# Altium footprint library SparkFun-Retired.PCBLIB: 303 footprints (part 6 of 19)
Each footprint in its own frame and in the unit in brackets; x right, y up, seen from the top. Pads: shape width x height; smd on the part's side, far side on the other; paste and mask are expansions set on the pad; w line width, h text height; cw(c..) or ccw(c..) is an arc to the next point about the centre after c.
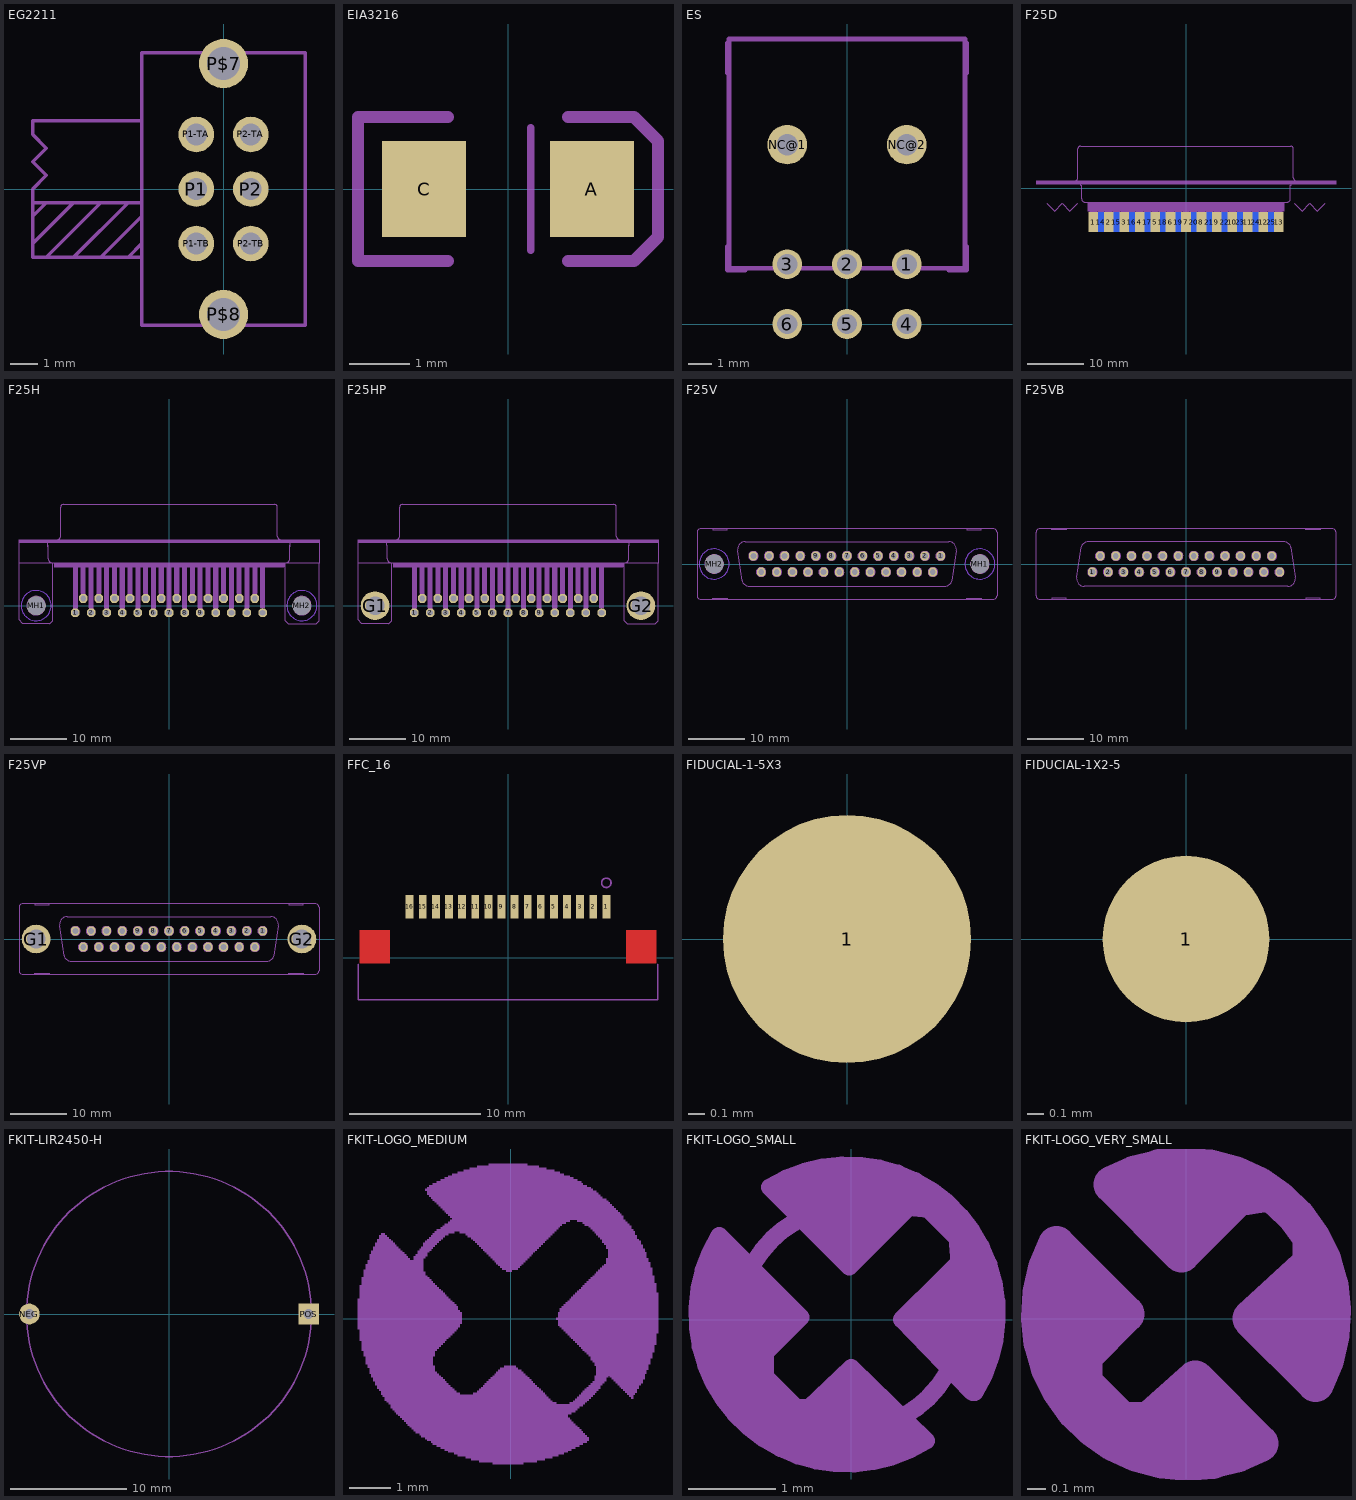
[diagram p5: the footprints below, top view; thin cyan lines are the x and y axes]

## EG2211 [mil]
pads (8):
  round 51.5 hole 31.5: P1(-39.37,0) P1-TA(-39.37,78.74) P1-TB(-39.37,-78.74) P2(39.37,0) P2-TA(39.37,78.74) P2-TB(39.37,-78.74)
  round 70.86 hole 47.24: P$7(0,181.1) P$8(0,-181.1)
tDocu:
  lines w5: -118.11,-59.06 -118.11,-39.37 ; -275.59,-78.74 -275.59,-98.43 -255.91,-98.43 ; -275.59,-78.74 -275.59,-39.37 ; -275.59,-78.74 -216.54,-19.69 ; -275.59,-39.37 -275.59,-19.69 ; -275.59,-39.37 -255.91,-19.69 ; -275.59,-19.69 -275.59,0 -255.91,19.69 -275.59,39.37 -255.91,59.06 -275.59,78.74 -275.59,98.43 -118.11,98.43 ; -275.59,-19.69 -255.91,-19.69 ; -255.91,-98.43 -216.54,-98.43 ; -255.91,-98.43 -177.17,-19.69 ; -255.91,-19.69 -216.54,-19.69 ; -216.54,-98.43 -177.17,-98.43 ; -216.54,-98.43 -137.8,-19.69 -118.11,-19.69 ; -216.54,-19.69 -177.17,-19.69 ; -177.17,-98.43 -137.8,-98.43 ; -177.17,-98.43 -118.11,-39.37 ; -177.17,-19.69 -118.11,-19.69 ; -137.8,-98.43 -118.11,-98.43 ; -137.8,-98.43 -118.11,-78.74 ; -118.11,-98.43 -118.11,-78.74 ; -118.11,-98.43 -118.11,-196.85 118.11,-196.85 118.11,196.85 -118.11,196.85 -118.11,98.43 ; -118.11,-78.74 -118.11,-39.37 ; -118.11,-39.37 -118.11,-19.69 ; -118.11,-19.69 -118.11,98.43

## EIA3216 [mil]
pads (2):
  rect 55.12x62.99 smd: A(55.12,0) C(-55.12,0)
tPlace:
  lines w5: 15,-40 15,40
  lines w8: -39.37,-47.24 -98.43,-47.24 -98.43,47.24 -39.37,47.24 ; 39.37,-47.24 82.68,-47.24 98.43,-31.5 98.43,31.5 82.68,47.24 39.37,47.24

## ES [mil]
pads (8):
  round 50 hole 34: 1(100,100) 2(0,100) 3(-100,100) 4(100,0) 5(0,0) 6(-100,0)
  round 66 hole 35.43: NC@1(-100,300) NC@2(100,300)
tDocu:
  lines w8: -197.5,93.25 197.5,93.25 197.5,476.75 -197.5,476.75 -197.5,93.25
tPlace:
  lines w8: -200,130 -200,90 -170,90 ; -200,420 -200,470 ; 170,90 200,90 200,130 ; 200,420 200,470

## F25D [mil]
pads (25):
  rect 66.93x137.8 smd paste+0: 1(-648.01,-237.98) 2(-540,-237.99) 3(-431.99,-237.98) 4(-324.01,-237.98) 5(-215.99,-237.98) 6(-108.01,-237.98) 7(0,-237.99) 8(108.01,-237.98) 9(215.99,-237.98) 10(324.01,-237.98) 11(431.99,-237.98) 12(540,-237.99) 13(648.01,-237.98)
  rect 66.93x137.8 smd far side paste+0: 14(-594,-238) 15(-486,-238) 16(-378,-238) 17(-270,-238) 18(-162,-238) 19(-54,-238) 20(54,-238) 21(162,-238) 22(270,-238) 23(378,-238) 24(486,-238) 25(594,-238)
tDocu:
  region: -671.62,-258.27 -671.62,-159.84 -624.38,-159.84 -624.38,-258.27
  region: -563.62,-258.27 -563.62,-159.84 -516.38,-159.84 -516.38,-258.27
  region: -455.62,-258.27 -455.62,-159.84 -408.38,-159.84 -408.38,-258.27
  region: -347.62,-258.27 -347.62,-159.84 -300.38,-159.84 -300.38,-258.27
  region: -239.62,-258.27 -239.62,-159.84 -192.38,-159.84 -192.38,-258.27
  region: -131.62,-258.27 -131.62,-159.84 -84.38,-159.84 -84.38,-258.27
  region: -23.62,-258.27 -23.62,-159.84 23.62,-159.84 23.62,-258.27
  region: 84.38,-258.27 84.38,-159.84 131.62,-159.84 131.62,-258.27
  region: -1047.24,27.56 -1047.24,51.18 1047.24,51.18 1047.24,27.56
  region: -685.04,-161.42 -685.04,-98.43 685.04,-98.43 685.04,-161.42
  region: 192.38,-258.27 192.38,-159.84 239.62,-159.84 239.62,-258.27
  region: 300.38,-258.27 300.38,-159.84 347.62,-159.84 347.62,-258.27
  region: 408.38,-258.27 408.38,-159.84 455.62,-159.84 455.62,-258.27
  region: 516.38,-258.27 516.38,-159.84 563.62,-159.84 563.62,-258.27
  region: 624.38,-258.27 624.38,-159.84 671.62,-159.84 671.62,-258.27
  lines w6: -780,48 ccw(c-780,73) -755,73 -755,273 cw(c-735,273) -735,293 730,293 cw(c730,273) 750,273 750,73 ccw(c775,73) 775,48 ; -734,40 -734,20 -729,20 -729,-75 ccw(c-704,-75) -704,-100 ; -704.76,-100 704.76,-100 ; 704,-100 ccw(c704,-75) 729,-75 729,20 734,20 734,40
  text "1" at -665.07,-85.77 h77.5
  text "F25D" at -678,181 h77.5
  text "13" at 612.51,-81.83 h77.5
bDocu:
  region: -617.62,-258.27 -617.62,-159.84 -570.38,-159.84 -570.38,-258.27
  region: -509.62,-258.27 -509.62,-159.84 -462.38,-159.84 -462.38,-258.27
  region: -401.62,-258.27 -401.62,-159.84 -354.38,-159.84 -354.38,-258.27
  region: -293.62,-258.27 -293.62,-159.84 -246.38,-159.84 -246.38,-258.27
  region: -185.62,-258.27 -185.62,-159.84 -138.38,-159.84 -138.38,-258.27
  region: -77.62,-258.27 -77.62,-159.84 -30.38,-159.84 -30.38,-258.27
  region: 30.38,-258.27 30.38,-159.84 77.62,-159.84 77.62,-258.27
  region: 138.38,-258.27 138.38,-159.84 185.62,-159.84 185.62,-258.27
  region: 246.38,-258.27 246.38,-159.84 293.62,-159.84 293.62,-258.27
  region: 354.38,-258.27 354.38,-159.84 401.62,-159.84 401.62,-258.27
  region: 462.38,-258.27 462.38,-159.84 509.62,-159.84 509.62,-258.27
  region: 570.38,-258.27 570.38,-159.84 617.62,-159.84 617.62,-258.27
bPlace:
  text "25" at 626.56,-32.48 h77.5
  text "14" at -553.13,-32.48 h77.5
Document:
  lines w0: -972,-108 -918,-162 -864,-108 -810,-162 -756,-108 ; 756,-108 810,-162 864,-108 918,-162 972,-108
  text "Board" at 774,-100 h77.5
  text "Board" at -974,-100 h77.5

## F25H [mil]
pads (27):
  oct 60x60 / inner round 55.43 / far side oct 60x60 hole 40: 1(-652,-50) 2(-543,-50) 3(-435,-50) 4(-326,-50) 5(-217,-50) 6(-109,-50) 7(0,-50) 8(109,-50) 9(217,-50) 10(326,-50) 11(435,-50) 12(543,-50) 13(652,-50) 14(-598,50) 15(-489,50) 16(-380,50) 17(-272,50) 18(-163,50) 19(-54,50) 20(54,50) 21(163,50) 22(272,50) 23(380,50) 24(489,50) 25(598,50)
  round 130 hole 130 unplated: MH1(-926,0) MH2(926,0)
Top keep-out:
  circle w0: c-926,0 r105
  circle w0: c926,0 r105
Bottom keep-out:
  circle w0: c-926,0 r105
  circle w0: c926,0 r105
tDocu:
  lines w6: 652,-45 652,-5
  lines w32: -652,-45 -652,-5 ; -598,55 -598,95 ; -543,-45 -543,-5 ; -489,55 -489,95 ; -435,-45 -435,-5 ; -380,55 -380,95 ; -326,-45 -326,-5 ; -272,55 -272,95 ; -217,-45 -217,-5 ; -163,55 -163,95 ; -109,-45 -109,-5 ; -54,55 -54,95 ; 0,-45 0,-5 ; 54,55 54,95 ; 109,-45 109,-5 ; 163,55 163,95 ; 217,-45 217,-5 ; 271,55 271,95 ; 326,-45 326,-5 ; 380,55 380,95 ; 435,-45 435,-5 ; 489,55 489,95 ; 543,-45 543,-5 ; 598,55 598,95
tPlace:
  drawing of 84 lines, arcs and shapes, not listed
  text "1" at -735,-75 h77.5
  text "13" at 700,-75 h77.5
  text "14" at -770,25 h77.5
  text "25" at 700,25 h77.5
  text "2,54" at 1025,100 h77.5
  text "F25" at -735,335 h77.5

## F25HP [mil]
pads (27):
  oct 60x60 / inner round 55.43 / far side oct 60x60 hole 40: 1(-652,-50) 2(-543,-50) 3(-435,-50) 4(-326,-50) 5(-217,-50) 6(-109,-50) 7(0,-50) 8(109,-50) 9(217,-50) 10(326,-50) 11(435,-50) 12(543,-50) 13(652,-50) 14(-598,50) 15(-489,50) 16(-380,50) 17(-272,50) 18(-163,50) 19(-54,50) 20(54,50) 21(163,50) 22(272,50) 23(380,50) 24(489,50) 25(598,50)
  round 200 hole 130: G1(-926,0) G2(926,0)
tDocu:
  lines w6: 652,-45 652,-5
  lines w32: -652,-45 -652,-5 ; -598,55 -598,95 ; -543,-45 -543,-5 ; -489,55 -489,95 ; -435,-45 -435,-5 ; -380,55 -380,95 ; -326,-45 -326,-5 ; -272,55 -272,95 ; -217,-45 -217,-5 ; -163,55 -163,95 ; -109,-45 -109,-5 ; -54,55 -54,95 ; 0,-45 0,-5 ; 54,55 54,95 ; 109,-45 109,-5 ; 163,55 163,95 ; 217,-45 217,-5 ; 272,55 272,95 ; 326,-45 326,-5 ; 380,55 380,95 ; 435,-45 435,-5 ; 488,55 488,95 ; 543,-45 543,-5 ; 597,55 597,95
tPlace:
  drawing of 82 lines, arcs and shapes, not listed
  text "1" at -735,-75 h77.5
  text "13" at 700,-75 h77.5
  text "14" at -770,25 h77.5
  text "25" at 700,25 h77.5
  text "2,54" at 1025,100 h77.5
  text "F25" at -735,335 h77.5

## F25V [mil]
pads (27):
  oct 60x60 / inner round 55.43 / far side oct 60x60 hole 40: 1(652,56) 2(543,56) 3(435,56) 4(326,56) 5(217,56) 6(109,56) 7(0,56) 8(-109,56) 9(-217,56) 10(-326,56) 11(-435,56) 12(-543,56) 13(-652,56) 14(598,-56) 15(489,-56) 16(380,-56) 17(272,-56) 18(163,-56) 19(54,-56) 20(-54,-56) 21(-163,-56) 22(-272,-56) 23(-380,-56) 24(-489,-56) 25(-598,-56)
  round 130 hole 130 unplated: MH1(926,0) MH2(-926,0)
Top keep-out:
  circle w0: c926,0 r105
  circle w0: c-926,0 r105
Bottom keep-out:
  circle w0: c926,0 r105
  circle w0: c-926,0 r105
tDocu:
  circle w10: c54,-56 r30
  circle w10: c0,56 r30
  circle w10: c-54,-56 r30
  circle w10: c109,56 r30
  circle w10: c-109,56 r30
  circle w10: c163,-56 r30
  circle w10: c-163,-56 r30
  circle w10: c217,56 r30
  circle w10: c326,56 r30
  circle w10: c272,-56 r30
  circle w10: c380,-56 r30
  circle w10: c435,56 r30
  circle w10: c489,-56 r30
  circle w10: c543,56 r30
  circle w10: c598,-56 r30
  circle w10: c652,56 r30
  circle w10: c-217,56 r30
  circle w10: c-326,56 r30
  circle w10: c-435,56 r30
  circle w10: c-272,-56 r30
  circle w10: c-380,-56 r30
  circle w10: c-489,-56 r30
  circle w10: c-543,56 r30
  circle w10: c-652,56 r30
  circle w10: c-598,-56 r30
tPlace:
  circle w6: c-926,0 r65
  circle w6: c926,0 r65
  lines w6: -762,92 -731,-116 ; -761.97,91.61 cw(c-710,102) -710,155 710,155 cw(c710,101.99) 761.79,90.7 ; -731.3,-115.33 ccw(c-680,-101.99) -680,-155 680,-155 ccw(c679.99,-102) 731.52,-114.37 ; 731,-115 762,91 ; -935,-245 -935,-240 -835,-240 -835,-245 ; -935,-245 -835,-245 ; -935,-245 -1020,-245 cw(c-1020,-220) -1045,-220 -1045,220 cw(c-1020,220) -1020,245 -935,245 ; -935,245 -935,240 -835,240 -835,245 ; -935,245 -835,245 ; -835,-245 835,-245 ; -835,245 835,245 ; 835,-245 835,-240 935,-240 935,-245 ; 835,-245 935,-245 ; 835,245 835,240 935,240 935,245 ; 835,245 935,245 ; 935,-245 1020,-245 ccw(c1020,-220) 1045,-220 1045,220 ccw(c1020,220) 1020,245 935,245
  text "1" at 640,100 h60.45
  text "2" at 525,100 h60.45
  text "3" at 420,100 h60.45
  text "4" at 310,100 h60.45
  text "5" at 200,100 h60.45
  text "6" at 90,100 h60.45
  text "7" at -15,100 h60.45
  text "8" at -125,100 h60.45
  text "9" at -235,100 h60.45
  text "10" at -355,100 h60.45
  text "11" at -460,100 h60.45
  text "12" at -570,100 h60.45
  text "13" at -680,100 h60.45
  text "25" at -635,-140 h60.45
  text "24" at -525,-140 h60.45
  text "23" at -410,-140 h60.45
  text "22" at -300,-140 h60.45
  text "21" at -195,-140 h60.45
  text "20" at -90,-140 h60.45
  text "19" at 25,-140 h60.45
  text "18" at 130,-140 h60.45
  text "17" at 235,-140 h60.45
  text "16" at 345,-140 h60.45
  text "15" at 455,-140 h60.45
  text "14" at 565,-140 h60.45

## F25VB [mil]
pads (25):
  oct 60x60 / inner round 55.43 / far side oct 60x60 hole 40: 1(-652,-56) 2(-543,-56) 3(-435,-56) 4(-326,-56) 5(-217,-56) 6(-109,-56) 7(0,-56) 8(109,-56) 9(217,-56) 10(326,-56) 11(435,-56) 12(543,-56) 13(652,-56) 14(-598,56) 15(-489,56) 16(-380,56) 17(-272,56) 18(-163,56) 19(-54,56) 20(54,56) 21(163,56) 22(272,56) 23(380,56) 24(489,56) 25(598,56)
tDocu:
  circle w10: c-54,56 r30
  circle w10: c0,-56 r30
  circle w10: c54,56 r30
  circle w10: c-109,-56 r30
  circle w10: c109,-56 r30
  circle w10: c-163,56 r30
  circle w10: c163,56 r30
  circle w10: c-217,-56 r30
  circle w10: c-326,-56 r30
  circle w10: c-272,56 r30
  circle w10: c-380,56 r30
  circle w10: c-435,-56 r30
  circle w10: c-489,56 r30
  circle w10: c-543,-56 r30
  circle w10: c-598,56 r30
  circle w10: c-652,-56 r30
  circle w10: c217,-56 r30
  circle w10: c326,-56 r30
  circle w10: c435,-56 r30
  circle w10: c272,56 r30
  circle w10: c380,56 r30
  circle w10: c489,56 r30
  circle w10: c543,-56 r30
  circle w10: c652,-56 r30
  circle w10: c598,56 r30
tPlace:
  lines w6: -762,-91 -731,115 ; -761.79,-90.7 ccw(c-710,-101.99) -710,-155 710,-155 ccw(c710,-102) 761.97,-91.61 ; -731.52,114.37 cw(c-679.99,102) -680,155 680,155 cw(c680,101.99) 731.3,115.33 ; 731,116 762,-92 ; -935,-245 -1020,-245 cw(c-1020,-220) -1045,-220 -1045,220 cw(c-1020,220) -1020,245 -935,245 ; -935,-245 -935,-240 -835,-240 -835,-245 ; -935,-245 -835,-245 ; -935,245 -835,245 ; -935,245 -935,240 -835,240 -835,245 ; -835,-245 835,-245 ; -835,245 835,245 ; 835,-245 835,-240 935,-240 935,-245 ; 835,-245 935,-245 ; 835,245 935,245 ; 835,245 835,240 935,240 935,245 ; 935,-245 1020,-245 ccw(c1020,-220) 1045,-220 1045,220 ccw(c1020,220) 1020,245 935,245
  text "1" at -640,-100 h60.45
  text "2" at -525,-100 h60.45
  text "3" at -420,-100 h60.45
  text "4" at -310,-100 h60.45
  text "5" at -200,-100 h60.45
  text "6" at -90,-100 h60.45
  text "7" at 15,-100 h60.45
  text "8" at 125,-100 h60.45
  text "9" at 235,-100 h60.45
  text "10" at 355,-100 h60.45
  text "11" at 460,-100 h60.45
  text "12" at 570,-100 h60.45
  text "13" at 680,-100 h60.45
  text "25" at 635,140 h60.45
  text "24" at 525,140 h60.45
  text "23" at 410,140 h60.45
  text "22" at 300,140 h60.45
  text "21" at 195,140 h60.45
  text "20" at 90,140 h60.45
  text "19" at -25,140 h60.45
  text "18" at -130,140 h60.45
  text "17" at -235,140 h60.45
  text "16" at -345,140 h60.45
  text "15" at -455,140 h60.45
  text "14" at -565,140 h60.45

## F25VP [mil]
pads (27):
  oct 60x60 / inner round 55.43 / far side oct 60x60 hole 40: 1(652,56) 2(543,56) 3(435,56) 4(326,56) 5(217,56) 6(109,56) 7(0,56) 8(-109,56) 9(-217,56) 10(-326,56) 11(-435,56) 12(-543,56) 13(-652,56) 14(598,-56) 15(489,-56) 16(380,-56) 17(272,-56) 18(163,-56) 19(54,-56) 20(-54,-56) 21(-163,-56) 22(-272,-56) 23(-380,-56) 24(-489,-56) 25(-598,-56)
  round 200 hole 130: G1(-926,0) G2(926,0)
tDocu:
  circle w10: c54,-56 r30
  circle w10: c0,56 r30
  circle w10: c-54,-56 r30
  circle w10: c109,56 r30
  circle w10: c-109,56 r30
  circle w10: c163,-56 r30
  circle w10: c-163,-56 r30
  circle w10: c217,56 r30
  circle w10: c326,56 r30
  circle w10: c272,-56 r30
  circle w10: c380,-56 r30
  circle w10: c435,56 r30
  circle w10: c489,-56 r30
  circle w10: c543,56 r30
  circle w10: c598,-56 r30
  circle w10: c652,56 r30
  circle w10: c-217,56 r30
  circle w10: c-326,56 r30
  circle w10: c-435,56 r30
  circle w10: c-272,-56 r30
  circle w10: c-380,-56 r30
  circle w10: c-489,-56 r30
  circle w10: c-543,56 r30
  circle w10: c-652,56 r30
  circle w10: c-598,-56 r30
tPlace:
  circle w6: c-926,0 r65
  circle w6: c926,0 r65
  lines w6: -762,92 -731,-116 ; -761.97,91.61 cw(c-710,102) -710,155 710,155 cw(c710,101.99) 761.79,90.7 ; -731.3,-115.33 ccw(c-680,-101.99) -680,-155 680,-155 ccw(c679.99,-102) 731.52,-114.37 ; 731,-115 762,91 ; -935,-245 -935,-240 -835,-240 -835,-245 ; -935,-245 -835,-245 ; -935,-245 -1020,-245 cw(c-1020,-220) -1045,-220 -1045,220 cw(c-1020,220) -1020,245 -935,245 ; -935,245 -935,240 -835,240 -835,245 ; -935,245 -835,245 ; -835,-245 835,-245 ; -835,245 835,245 ; 835,-245 835,-240 935,-240 935,-245 ; 835,-245 935,-245 ; 835,245 835,240 935,240 935,245 ; 835,245 935,245 ; 935,-245 1020,-245 ccw(c1020,-220) 1045,-220 1045,220 ccw(c1020,220) 1020,245 935,245
  text "1" at 640,100 h60.45
  text "2" at 525,100 h60.45
  text "3" at 420,100 h60.45
  text "4" at 310,100 h60.45
  text "5" at 200,100 h60.45
  text "6" at 90,100 h60.45
  text "7" at -15,100 h60.45
  text "8" at -125,100 h60.45
  text "9" at -235,100 h60.45
  text "10" at -355,100 h60.45
  text "11" at -460,100 h60.45
  text "12" at -570,100 h60.45
  text "13" at -680,100 h60.45
  text "25" at -635,-140 h60.45
  text "24" at -525,-140 h60.45
  text "23" at -410,-140 h60.45
  text "22" at -300,-140 h60.45
  text "21" at -195,-140 h60.45
  text "20" at -90,-140 h60.45
  text "19" at 25,-140 h60.45
  text "18" at 130,-140 h60.45
  text "17" at 235,-140 h60.45
  text "16" at 345,-140 h60.45
  text "15" at 455,-140 h60.45
  text "14" at 565,-140 h60.45

## FFC_16 [mil]
pads (16):
  rect 23.62x70.87 smd: 1(295.28,153.54) 2(255.91,153.54) 3(216.54,153.54) 4(177.17,153.54) 5(137.8,153.54) 6(98.43,153.54) 7(59.06,153.54) 8(19.69,153.54) 9(-19.69,153.54) 10(-59.06,153.54) 11(-98.43,153.54) 12(-137.8,153.54) 13(-177.17,153.54) 14(-216.54,153.54) 15(-255.91,153.54) 16(-295.28,153.54)
Top:
  region: -444.88,-15.75 -444.88,82.68 -354.33,82.68 -354.33,-15.75
  region: 354.33,-15.75 354.33,82.68 444.88,82.68 444.88,-15.75
Top Paste:
  region: -445,85 -355,85 -355,-15 -445,-15
  region: 355,85 445,85 445,-15 355,-15
Top Solder:
  region: -450,90 -350,90 -350,-20 -450,-20
  region: 350,90 450,90 450,-20 350,-20
tPlace:
  circle w5: c295,225 r14.14
  lines w5: -448.82,-19.69 -448.82,-125.98 448.82,-125.98 448.82,-19.69

## FIDUCIAL-1-5X3 [mil]
pads (1):
  rrect100% 59.06x59.06 smd paste+0: 1(0,0)
Top Solder:
  circle w50: c0,0 r35.65

## FIDUCIAL-1X2-5 [mm]
pads (1):
  rrect100% 1x1 smd paste+0: 1(0,0)
Top Solder:
  circle w1.27: c0,0 r0.9

## FKIT-LIR2450-H [mil]
pads (2):
  round 70 hole 33.46: NEG(-472.44,0)
  rect 70x70 / inner round 64.67 / far side rect 70x70 hole 33.46: POS(472.44,0)
tDocu:
  circle w5: c0,0 r482.28
  text "+" at 330.71,-33.46 h155
  text "-" at -411.42,-35.43 h155

## FKIT-LOGO_MEDIUM [mil]
tPlace:
  drawing of 314 lines, arcs and shapes, not listed

## FKIT-LOGO_SMALL [mil]
tPlace:
  lines w8: -66,17 -39,-8 -42,-13 -65,10 -65,1 -42,-21 -43,-27 -65,-7 -62,-16 -9,-62 -23,-57 -59,-24 -34,-54 ; -62,23 -33,-5 ; -61,31 -32,1 ; -44,26 cw(c-1.5,1.5) -26,44 ; -31,61 30,59 ; -29,55 37,54 ; -23,-44 -2,-61 ; -21,49 19,49 ; -20,65 20,64 ; -16,44 14,44 ; -14,-43 5,-61 ; -12,-38 13,-59 ; -12,38 6,38 ; -7,-32 21,-58 ; -4,32 2,33 ; -3,-29 25,-53 ; 25,-43 ccw(c0.5,-0.5) 43,-25 ; 27,2 62,-3 ; 31,-3 62,-9 ; 34,7 66,3 ; 37,-9 61,-15 ; 39,52 48,44 ; 41,13 63,10 ; 44,-16 56,-20 ; 51,-22 54,-27 ; 51,23 58,22 ; 51,36 57,35 ; 52,30 59,29 ; 55,-33 23,0 42,19 ; 56,-33 ccw(c-1.5,2.5) -37,60 -1,24 26,51 35,50 48,37 49,26 42,19 ; 62,16 42,19 ; -60,38 ccw(c-2.12,2.5) 34,-55 0,-22 -19,-40 -25,-40 -39,-26 -39,-15 -23,1 -60,38

## FKIT-LOGO_VERY_SMALL [mil]
tPlace:
  lines w8: -27,-6 -26,8 ; -22,-5 -21,4 ; -7,25 0,28 ; -6,-26 9,-26 ; -2,23 8,29 ; -1,-20 6,-21 ; 17,27 11,26 -1,14 -16,29 cw(c-0.35,1) 28,-14 14,0 27,12 27,17 ; 21,-1 27,7 ; 25,-7 27,1 ; -28,16 ccw(c0.35,1) 16,-27 2,-13 -8,-22 -14,-22 -22,-14 -22,-8 -13,1 -28,16